# Altium footprint library PCBLib Matias.PcbLib: 46 footprints (part 3 of 3)
Each footprint in its own frame and in the unit in brackets; x right, y up, seen from the top. Pads: shape width x height; smd on the part's side, far side on the other; paste and mask are expansions set on the pad; w line width, h text height; cw(c..) or ccw(c..) is an arc to the next point about the centre after c.
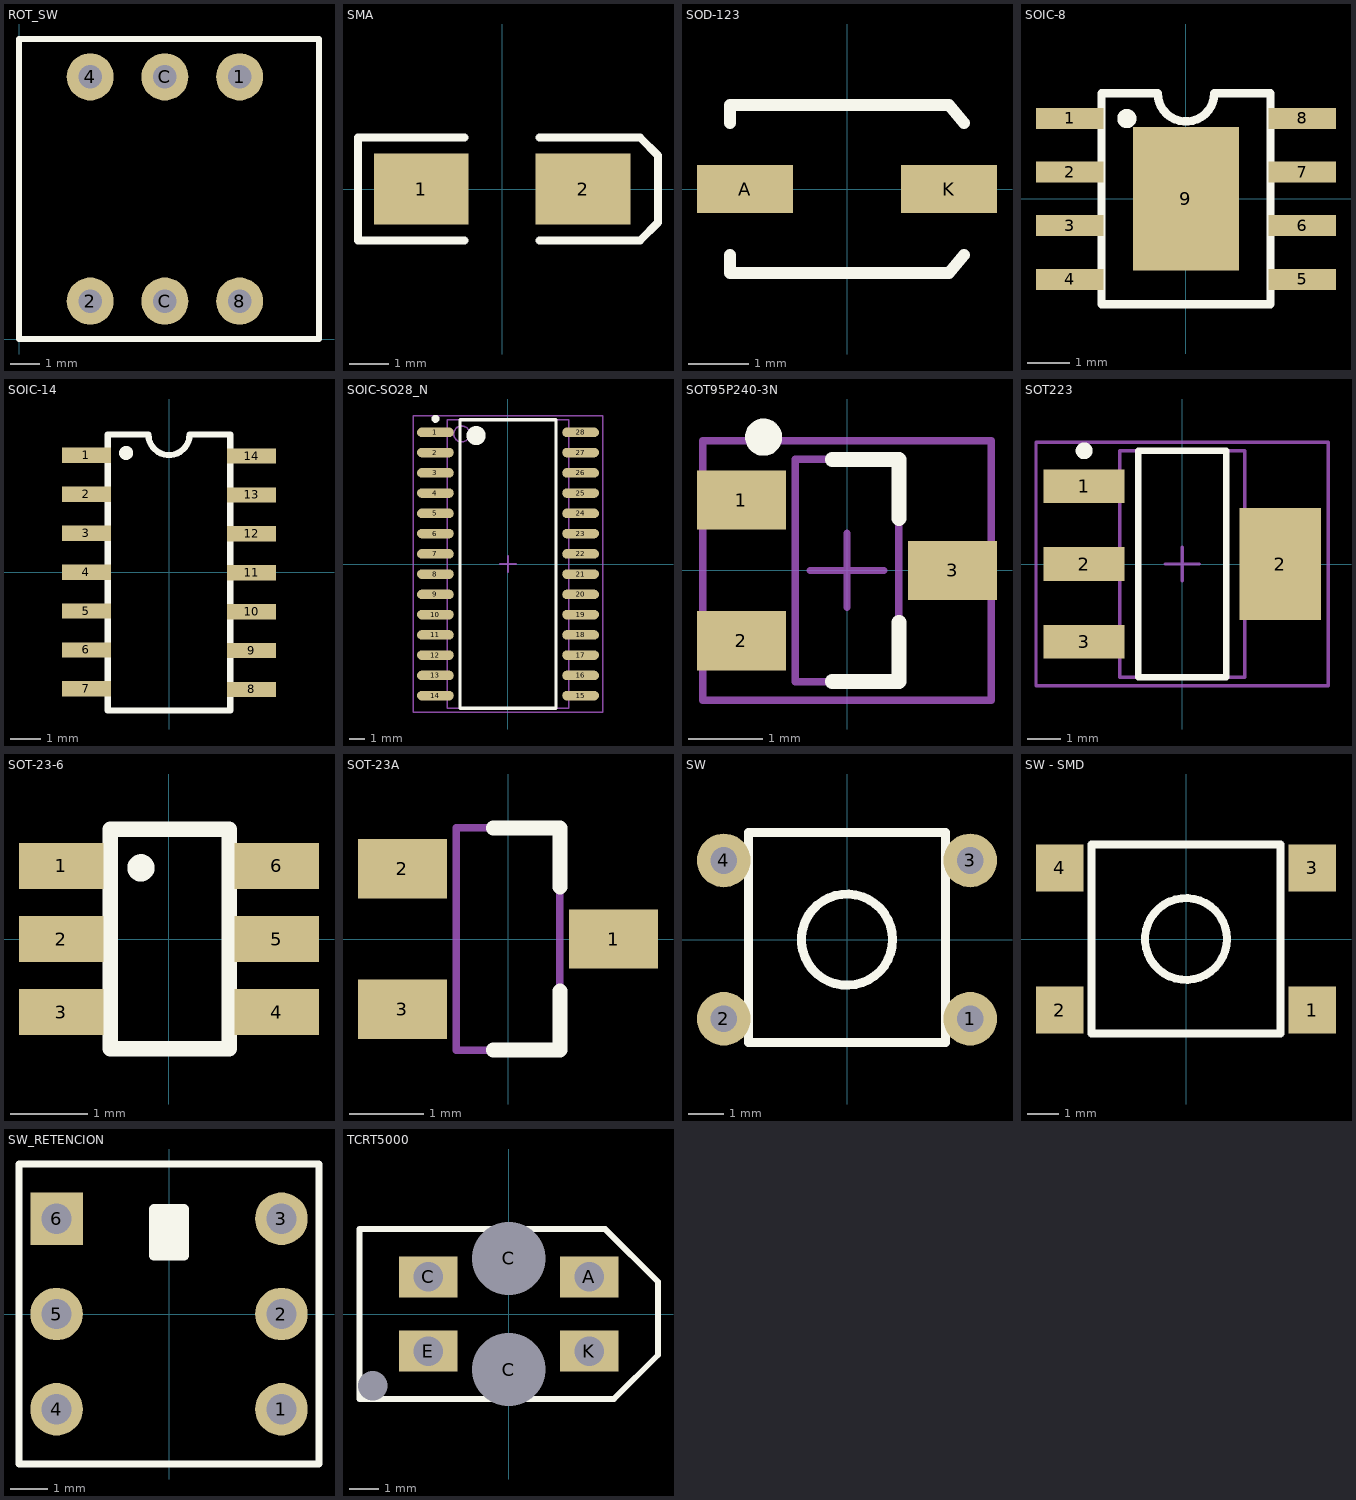
[diagram p2: the footprints below, top view; thin cyan lines are the x and y axes]

## ROT_SW [mm]
pads (6):
  round 1.6 hole 0.8: 1(7.5,8.91) 2(2.42,1.29) 4(2.42,8.91) 8(7.5,1.29) C(4.96,8.91) C(4.96,1.29)
Top Overlay:
  lines w0.2: 0,0 10.2,0 10.2,10.2 0,10.2 0,0

## SMA [mm]
pads (2):
  rect 2.4x1.8 smd: 1(-2.05,0) 2(2.05,0)
Top Overlay:
  lines w0.2: -0.95,-1.3 -3.65,-1.3 -3.65,1.3 -0.95,1.3 ; 0.95,-1.3 3.5,-1.3 3.95,-0.85 3.95,0.85 3.5,1.3 0.95,1.3
3D body "User Library-DO-214AC(SMA).STEP": height 2.27, standoff -0.01, extent -2.593,-1.444 2.893,1.35

## SOD-123 [mm] "SOD-123; 2 Leads; Body 2.7 x 1.6 mm, (LxW)"
height 1.35
pads (2):
  rect 1.6x0.8 smd: A(-1.7,0) K(1.7,0)
Top Overlay:
  lines w0.2: -1.95,-1.098 -1.95,-1.4 1.7,-1.4 1.95,-1.098 ; -1.95,1.098 -1.95,1.4 1.7,1.4 1.95,1.098
3D body "CircuitWorks-SOD123.step": height 1.27, standoff 0, extent -1.85,-0.8 1.85,0.8

## SOIC-8 [mm]
pads (9):
  rect 1.6x0.5 smd: 1(-2.75,1.905) 2(-2.75,0.635) 3(-2.75,-0.635) 4(-2.75,-1.905) 5(2.75,-1.905) 6(2.75,-0.635) 7(2.75,0.635) 8(2.75,1.905)
  rect 2.5x3.4 smd: 9(0,0)
Top Overlay:
  circle w0.254: c-1.4,1.9 r0.1
  lines w0.2: -2,-2.5 -2,2.5 -0.671,2.5 ccw(c0,2.5) 0.671,2.5 2,2.5 2,-2.5 -2,-2.5
3D body: height 0.25, standoff 0, extent -4.1,3 -4.1,3
3D body "User Library-so8-3.step": height 1.7, standoff 0, extent -3.1,-2.45 2.9,2.45
3D body "User Library-so8-3.step": height 1.6, standoff -0.1, extent -3.1,-2.4 2.9,2.5

## SOIC-14 [mm]
pads (14):
  rect 1.6x0.5 smd: 1(-2.7,3.82) 2(-2.7,2.55) 3(-2.7,1.28) 4(-2.7,0.01) 5(-2.7,-1.26) 6(-2.7,-2.53) 7(-2.7,-3.8) 8(2.7,-3.82) 9(2.7,-2.55) 10(2.7,-1.28) 11(2.7,-0.01) 12(2.7,1.26) 13(2.7,2.53) 14(2.7,3.8)
Top Overlay:
  circle w0.254: c-1.4,3.9 r0.1
  lines w0.2: -2,-4.5 -2,4.5 -0.671,4.5 ccw(c0,4.5) 0.671,4.5 2,4.5 2,-4.5 -2,-4.5
3D body: height 0.25, standoff 0, extent -4.15,3.625 -4.15,3.625
3D body "User Library-so8-3.step": height 1.7, standoff 0, extent -3.1,-2.45 2.9,2.45
3D body "User Library-SOIC14.step": height 1.75, standoff 0, extent -2.85,-4.275 2.95,4.275

## SOIC-SO28_N [mm]
pads (28):
  oval 2.3x0.6 smd: 1(-4.55,8.255) 2(-4.55,6.985) 3(-4.55,5.715) 4(-4.55,4.445) 5(-4.55,3.175) 6(-4.55,1.905) 7(-4.55,0.635) 8(-4.55,-0.635) 9(-4.55,-1.905) 10(-4.55,-3.175) 11(-4.55,-4.445) 12(-4.55,-5.715) 13(-4.55,-6.985) 14(-4.55,-8.255) 15(4.55,-8.255) 16(4.55,-6.985) 17(4.55,-5.715) 18(4.55,-4.445) 19(4.55,-3.175) 20(4.55,-1.905) 21(4.55,-0.635) 22(4.55,0.635) 23(4.55,1.905) 24(4.55,3.175) 25(4.55,4.445) 26(4.55,5.715) 27(4.55,6.985) 28(4.55,8.255)
Top Overlay:
  circle w0.25: c-4.55,9.105 r0.125
  circle w0.6: c-2,8.05 r0.3
  lines w0.2: -3,-9.05 -3,9.05 3,9.05 3,-9.05 -3,-9.05
Mechanical 13:
  circle w0.1: c-2.9,8.155 r0.5
  lines w0.1: -3.8,-9.055 -3.8,9.055 3.8,9.055 3.8,-9.055 -3.8,-9.055
Mechanical 15:
  lines w0.1: -0.5,0 0.5,0 ; 0,-0.5 0,0.5 ; -5.95,-9.3 -5.95,9.3 5.95,9.3 5.95,-9.3 -5.95,-9.3
3D body "User Library-SOIC-28-300.STEP": height 2.57, standoff -0.03, extent -5.2,-9.05 5.4,9.05

## SOT95P240-3N [mm]
pads (3):
  rect 1.2x0.8 smd: 1(-1.425,0.95) 2(-1.425,-0.95) 3(1.425,0)
Top Overlay:
  circle w0.25: c-1.125,1.8 r0.125
  lines w0.2: -0.2,-1.5 0.7,-1.5 0.7,-0.7 ; -0.2,1.5 0.7,1.5 0.7,0.7
Mechanical 13:
  lines w0.1: -0.7,-1.5 -0.7,1.5 0.7,1.5 0.7,-1.5 -0.7,-1.5
Mechanical 15:
  lines w0.1: -0.5,0 0.5,0 ; 0,-0.5 0,0.5 ; -1.95,-1.75 -1.95,1.75 1.95,1.75 1.95,-1.75 -1.95,-1.75
3D body "User Library-SOT95P240X110-3M[SOT23-3_TO-236AB].STEP": height 1.08, standoff -0.01, extent -1.15,-1.45 1.35,1.55

## SOT223 [mm] "SOT223, 4-Leads, Body 6,7x7,3mm (max), Pitch 2,30mm, IPC Medium Density"
height 1.8
pads (4):
  rect 2.4x1 smd: 1(-2.9,2.3) 2(-2.9,0) 3(-2.9,-2.3)
  rect 2.4x3.3 smd: 2(2.9,0)
Top Overlay:
  circle w0.25: c-2.9,3.35 r0.125
  lines w0.2: -1.3,-3.35 1.3,-3.35 1.3,3.35 -1.3,3.35 -1.3,-3.35
Mechanical 13:
  lines w0.1: -1.85,-3.35 1.85,-3.35 1.85,3.35 -1.85,3.35 -1.85,-3.35
Mechanical 15:
  lines w0.1: -0.5,0 0.5,0 ; 0,-0.5 0,0.5 ; -4.325,-3.6 4.325,-3.6 4.325,3.6 -4.325,3.6 -4.325,-3.6
3D body "User Library-sot-223.step": height 1.64, standoff -0.04, extent -3.366,-3.25 3.566,3.25

## SOT-23-6 [mm]
pads (6):
  rect 1.1x0.6 smd: 1(-1.4,0.95) 2(-1.4,0) 3(-1.4,-0.95) 4(1.4,-0.95) 5(1.4,0) 6(1.4,0.95)
Top Overlay:
  circle w0.254: c-0.365,0.925 r0.05
  lines w0.2: -0.765,-1.425 -0.765,1.425 0.785,1.425 0.785,-1.425 -0.765,-1.425
3D body "User Library-SOT23-6-2.STEP": height 1.43, standoff -0.02, extent -1.35,-1.45 1.45,1.45

## SOT-23A [mm]
pads (3):
  rect 1.2x0.8 smd: 1(1.425,0) 2(-1.425,0.95) 3(-1.425,-0.95)
Top Overlay:
  lines w0.2: -0.2,-1.5 0.7,-1.5 0.7,-0.7 ; -0.2,1.5 0.7,1.5 0.7,0.7
Mechanical 13:
  lines w0.1: -0.7,-1.5 -0.7,1.5 0.7,1.5 0.7,-1.5 -0.7,-1.5
3D body "User Library-SOT95P240X110-3M[SOT23-3_TO-236AB].STEP": height 1.08, standoff -0.01, extent -1.15,-1.45 1.35,1.55

## SW [mil]
pads (4):
  round 60 hole 30: 1(137.8,-88.58) 2(-137.8,-88.58) 3(137.8,88.58) 4(-137.8,88.58)
Top Overlay:
  circle w10: c0,0 r50.99
  lines w10: -110,-115 -110,120 110,120 110,-115 -110,-115
3D body "Tact SW.stp": height 177.17, standoff -129.92, extent -151.57,-118.1 151.58,118.12

## SW - SMD [mm]
pads (4):
  rect 1.5x1.5 smd: 1(4,-2.25) 2(-4,-2.25) 3(4,2.25) 4(-4,2.25)
Top Overlay:
  circle w0.254: c0,0 r1.295
  lines w0.254: -3,-3 3,-3 3,3 -3,3 -3,-3
3D body "User Library-WS-TSS_430152095836.step": height 9.41, standoff -0.1, extent -4.5,-3.1 4.5,3.1

## SW_RETENCION [mm]
pads (6):
  round 1.4 hole 0.8: 1(3,-2.54) 2(3,0) 3(3,2.54) 4(-3,-2.54) 5(-3,0)
  rect 1.4x1.4 hole 0.8: 6(-3,2.54)
Top Overlay:
  rectangle: -0.4,1.55 0.4,2.8
  lines w0.2: -4,-4 -4,4 4,4 4,-4 -4,-4
  lines w0.254: -0.4,1.55 -0.4,2.8 0.4,2.8 0.4,1.55 -0.4,1.55

## TCRT5000 [mm]
pads (7):
  rect 2x1.4 hole 1: A(2.75,1.27) C(-2.75,1.27) E(-2.75,-1.27) K(2.75,-1.27)
  round 0 hole 1: C(-4.65,-2.45)
  round 1.8 hole 2.5: C(0,-1.9) C(0,1.9)
Top Overlay:
  lines w0.2: -5.1,-2.9 -5.1,2.9 3.3,2.9 5.1,1.1 5.1,-1.4 3.6,-2.9 -5.1,-2.9
3D body "TCRT5000.stp": height 6.98, standoff -5.02, extent -5,-3.4 5.2,3.4